# Altium footprint library IC.PcbLib: 85 footprints (part 5 of 6)
Each footprint in its own frame and in the unit in brackets; x right, y up, seen from the top. Pads: shape width x height; smd on the part's side, far side on the other; paste and mask are expansions set on the pad; w line width, h text height; cw(c..) or ccw(c..) is an arc to the next point about the centre after c.
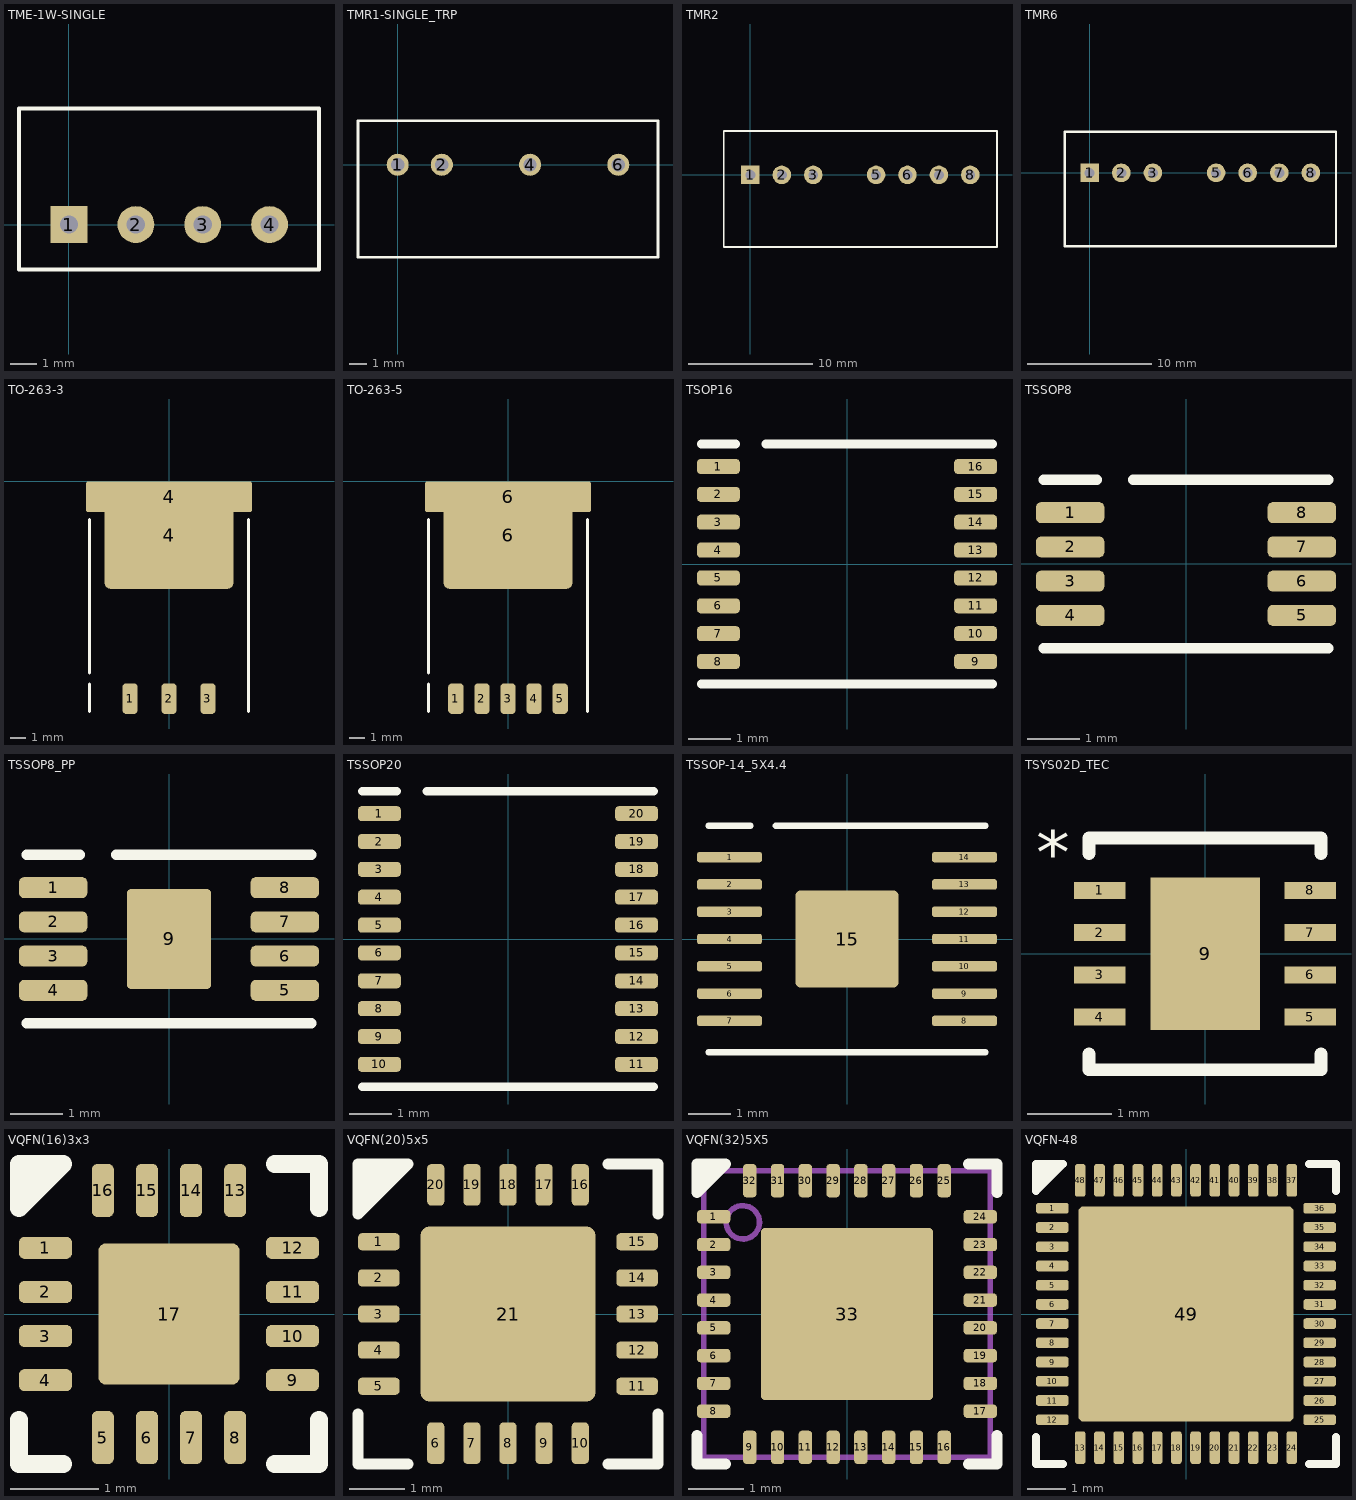
[diagram p4: the footprints below, top view; thin cyan lines are the x and y axes]

## TME-1W-SINGLE [mm]
pads (4):
  rect 1.4x1.4 hole 0.7: 1(0,0)
  round 1.4 hole 0.7: 2(2.54,0) 3(5.08,0) 4(7.62,0)
Top Overlay:
  lines w0.152: -1.9,-1.7 -1.9,4.4 9.5,4.4 9.5,-1.7 -1.9,-1.7
3D body: height 0.25, standoff 0, extent 0,0 0.254,0.254
3D body "tme_3d_drawing.stp": height 10, standoff -3.1, extent -1.89,-1.679 9.51,4.321

## TMR1-SINGLE_TRP [mil]
pads (4):
  round 50 hole 30: 1(0,0) 2(100,0) 4(300,0) 6(500,0)
Top Overlay:
  lines w6: -90,-210 -90,100 590,100 590,-210 -90,-210
3D body: height 10, standoff 0, extent 0,0 10,10
3D body "tmr1_single_3d_drawing.stp": height 413.39, standoff -145.67, extent -84.64,-205 584.65,95

## TMR2 [mm]
pads (7):
  rect 1.5x1.5 / inner round 1.27 / far side round 1.27 hole 0.8: 1(0,0)
  round 1.5 / inner round 1.27 / far side round 1.27 hole 0.8: 2(2.54,0) 3(5.08,0) 5(10.16,0) 6(12.7,0) 7(15.24,0) 8(17.78,0)
Top Overlay:
  lines w0.152: -2.159,-5.842 -2.159,3.556 19.939,3.556 19.939,-5.842 -2.159,-5.842
Bottom Overlay:
  circle w0.508: c-3.937,0 r0.381
3D body "tmr2_3d_drawing (1).stp": height 11.2, standoff -4.1, extent -2,-5.8 19.8,3.3

## TMR6 [mm]
pads (7):
  rect 1.5x1.5 / inner round 1.27 / far side round 1.27 hole 0.8: 1(0,0)
  round 1.5 / inner round 1.27 / far side round 1.27 hole 0.8: 2(2.54,0) 3(5.08,0) 5(10.16,0) 6(12.7,0) 7(15.24,0) 8(17.78,0)
Top Overlay:
  lines w0.2: -2,-5.9 -2,3.3 19.8,3.3 19.8,-5.9 -2,-5.9
Bottom Overlay:
  circle w0.508: c-3.937,0 r0.381
3D body "tmr6_3d_drawing.stp": height 11.2, standoff -4.1, extent -2,-5.82 19.8,3.28

## TO-263-3 [mm]
pads (5):
  rrect50% 1x2 smd: 1(-2.54,-14.17) 2(0,-14.17) 3(2.54,-14.17)
  rrect10% 8.4x7 smd: 4(0,-3.5)
  rrect10% 10.8x2 smd: 4(0,-1)
Top Overlay:
  lines w0.2: -5.2,-15 -5.2,-13.2 ; -5.2,-12.5 -5.2,-2.5 ; 5.2,-15 5.2,-2.5
3D body "LM1084IS-ADJ.STEP": height 4.65, standoff -0.15, extent -5.08,-14.651 5.08,-0.3

## TO-263-5 [mm]
pads (7):
  rrect50% 1x2 smd: 1(-3.4,-14.17) 2(-1.7,-14.17) 3(0,-14.17) 4(1.7,-14.17) 5(3.4,-14.17)
  rrect10% 8.4x7 smd: 6(0,-3.5)
  rrect10% 10.8x2 smd: 6(0,-1)
Top Overlay:
  lines w0.2: -5.2,-15 -5.2,-13.2 ; -5.2,-12.5 -5.2,-2.5 ; 5.2,-15 5.2,-2.5
3D body "KTT0005B.stp": height 4.57, standoff -0.15, extent -5.08,-14.7 5.08,-0.4

## TSOP16 [mm]
pads (16):
  rrect50% 1x0.35 smd: 1(-3,2.275) 2(-3,1.625) 3(-3,0.975) 4(-3,0.325) 5(-3,-0.325) 6(-3,-0.975) 7(-3,-1.625) 8(-3,-2.275) 9(3,-2.275) 10(3,-1.625) 11(3,-0.975) 12(3,-0.325) 13(3,0.325) 14(3,0.975) 15(3,1.625) 16(3,2.275)
Top Overlay:
  lines w0.2: -3.4,-2.8 3.4,-2.8 ; -3.4,2.8 -2.6,2.8 ; -1.9,2.8 3.4,2.8
3D body "User Library-User Library-TSSOP16.step": height 1.1, standoff 0, extent -3.19,-2.5 3.21,2.5

## TSSOP8 [mm]
pads (8):
  rrect50% 1.3x0.4 smd: 1(-2.2,0.975) 2(-2.2,0.325) 3(-2.2,-0.325) 4(-2.2,-0.975) 5(2.2,-0.975) 6(2.2,-0.325) 7(2.2,0.325) 8(2.2,0.975)
Top Overlay:
  lines w0.2: -2.7,-1.6 2.7,-1.6 ; -2.7,1.6 -1.7,1.6 ; -1,1.6 2.7,1.6
3D body "DGN0008D.stp": height 1.05, standoff -0.02, extent -2.45,-1.5 2.45,1.5

## TSSOP8_PP [mm]
pads (9):
  rrect50% 1.3x0.4 smd: 1(-2.2,0.975) 2(-2.2,0.325) 3(-2.2,-0.325) 4(-2.2,-0.975) 5(2.2,-0.975) 6(2.2,-0.325) 7(2.2,0.325) 8(2.2,0.975)
  rrect10% 1.6x1.9 smd: 9(0,0)
Top Overlay:
  lines w0.2: -2.7,-1.6 2.7,-1.6 ; -2.7,1.6 -1.7,1.6 ; -1,1.6 2.7,1.6
3D body "DGN0008D.stp": height 1.05, standoff -0.02, extent -2.45,-1.5 2.45,1.5

## TSSOP20 [mm]
pads (20):
  rrect50% 1x0.35 smd: 1(-3,2.925) 2(-3,2.275) 3(-3,1.625) 4(-3,0.975) 5(-3,0.325) 6(-3,-0.325) 7(-3,-0.975) 8(-3,-1.625) 9(-3,-2.275) 10(-3,-2.925) 11(3,-2.925) 12(3,-2.275) 13(3,-1.625) 14(3,-0.975) 15(3,-0.325) 16(3,0.325) 17(3,0.975) 18(3,1.625) 19(3,2.275) 20(3,2.925)
Top Overlay:
  lines w0.2: -3.4,-3.45 3.4,-3.45 ; -3.4,3.45 -2.6,3.45 ; -1.9,3.45 3.4,3.45
3D body "TSSOP20.step": height 1.2, standoff 0, extent -3.302,-3.302 3.302,3.302

## TSSOP-14_5X4.4 [mm]
pads (15):
  rrect50% 1.55x0.25 smd: 1(-2.8,1.95) 2(-2.8,1.3) 3(-2.8,0.65) 4(-2.8,0) 5(-2.8,-0.65) 6(-2.8,-1.3) 7(-2.8,-1.95) 8(2.8,-1.95) 9(2.8,-1.3) 10(2.8,-0.65) 11(2.8,0) 12(2.8,0.65) 13(2.8,1.3) 14(2.8,1.95)
  rrect10% 2.46x2.31 smd: 15(0,0)
Top Layer:
  region: 0,1.155
  region: 0,-1.155
Top Overlay:
  lines w0.152: -3.3,-2.7 0,-2.7 3.3,-2.7 ; -3.3,2.7 -2.3,2.7 ; -1.7,2.7 3.3,2.7
Top Solder:
  region: 0,1.155
  region: 0,-1.155
3D body "PWP0014E.stp": height 1.13, standoff 0, extent -3.2,-2.5 3.2,2.5

## TSYS02D_TEC [mil]
pads (9):
  rect 24x8 smd paste+0: 1(-49,29.53) 2(-49,9.84) 3(-49,-9.84) 4(-49,-29.53) 5(49,-29.53) 6(49,-9.84) 7(49,9.84) 8(49,29.53)
  rect 51x71 smd paste+0: 9(0,0)
Top Overlay:
  lines w6: -54,-46.63 -54,-54 54,-54 54,-46.63 ; -54,46.63 -54,54 54,54 54,46.63
  text "*" at -78.74,28.38 h39.37
3D body "TSYS02S_TEC.step": height 30.12, standoff 0, extent -49.01,-49.01 49.02,49.02

## VQFN(16)3x3 [mm]
pads (17):
  rrect50% 0.6x0.25 smd: 1(-1.4,0.75) 2(-1.4,0.25) 3(-1.4,-0.25) 4(-1.4,-0.75) 9(1.4,-0.75) 10(1.4,-0.25) 11(1.4,0.25) 12(1.4,0.75)
  rrect50% 0.25x0.6 smd paste-0.412: 5(-0.75,-1.4) 6(-0.25,-1.4) 7(0.25,-1.4) 8(0.75,-1.4) 13(0.75,1.4) 14(0.25,1.4) 15(-0.25,1.4) 16(-0.75,1.4)
  rrect10% 1.6x1.6 smd: 17(0,0)
Top Overlay:
  region: -1.7,1.7 -1.7,1.2 -1.2,1.7
  lines w0.2: -1.7,-1.2 -1.7,-1.7 -1.2,-1.7 ; 1.2,-1.7 1.7,-1.7 1.7,-1.2 ; 1.2,1.7 1.7,1.7 1.7,1.2 ; -1.7,1.2 -1.2,1.7 -1.7,1.7 -1.7,1.2
3D body "THS4513RGTT.STEP": height 1, standoff 0, extent -1.5,-1.5 1.5,1.5

## VQFN(20)5x5 [mm]
pads (21):
  rrect50% 0.75x0.31 smd: 1(-2.325,1.3) 2(-2.325,0.65) 3(-2.325,0) 4(-2.325,-0.65) 5(-2.325,-1.3) 11(2.325,-1.3) 12(2.325,-0.65) 13(2.325,0) 14(2.325,0.65) 15(2.325,1.3)
  rrect50% 0.31x0.75 smd: 6(-1.3,-2.325) 7(-0.65,-2.325) 8(0,-2.325) 9(0.65,-2.325) 10(1.3,-2.325) 16(1.3,2.325) 17(0.65,2.325) 18(0,2.325) 19(-0.65,2.325) 20(-1.3,2.325)
  rrect10% 3.15x3.15 smd: 21(0,0)
Top Overlay:
  region: -2.7,2.7 -2.7,1.8 -1.8,2.7
  lines w0.2: -2.7,-1.8 -2.7,-2.7 -1.8,-2.7 ; 1.8,-2.7 2.7,-2.7 2.7,-1.8 ; 1.8,2.7 2.7,2.7 2.7,1.8 ; -2.7,1.8 -1.8,2.7 -2.7,2.7 -2.7,1.8
3D body "TPS7A4700RGWT.STEP": height 1, standoff 0, extent -2.5,-2.5 2.5,2.5

## VQFN(32)5X5 [mm]
pads (33):
  rrect50% 0.6x0.24 smd: 1(-2.4,1.75) 2(-2.4,1.25) 3(-2.4,0.75) 4(-2.4,0.25) 5(-2.4,-0.25) 6(-2.4,-0.75) 7(-2.4,-1.25) 8(-2.4,-1.75) 17(2.4,-1.75) 18(2.4,-1.25) 19(2.4,-0.75) 20(2.4,-0.25) 21(2.4,0.25) 22(2.4,0.75) 23(2.4,1.25) 24(2.4,1.75)
  rrect50% 0.24x0.6 smd: 9(-1.75,-2.4) 10(-1.25,-2.4) 11(-0.75,-2.4) 12(-0.25,-2.4) 13(0.25,-2.4) 14(0.75,-2.4) 15(1.25,-2.4) 16(1.75,-2.4) 25(1.75,2.4) 26(1.25,2.4) 27(0.75,2.4) 28(0.25,2.4) 29(-0.25,2.4) 30(-0.75,2.4) 31(-1.25,2.4) 32(-1.75,2.4)
  rrect5% 3.1x3.1 smd: 33(0,0)
Top Overlay:
  region: -2.7,2.7 -2.7,2.2 -2.2,2.7
  lines w0.2: -2.7,-2.191 -2.7,-2.7 -2.191,-2.7 ; 2.191,-2.7 2.7,-2.7 2.7,-2.191 ; 2.191,2.7 2.7,2.7 2.7,2.191 ; -2.7,2.191 -2.191,2.7 -2.7,2.7 -2.7,2.191
Top Paste:
  region: 0.15,-0.1 0.1,-0.15 0.1,-1.4 0.15,-1.45 1.4,-1.45 1.45,-1.4 1.45,-0.15 1.4,-0.1
  region: -0.15,-0.1 -0.1,-0.15 -0.1,-1.4 -0.15,-1.45 -1.4,-1.45 -1.45,-1.4 -1.45,-0.15 -1.4,-0.1
  region: -0.15,0.1 -0.1,0.15 -0.1,1.4 -0.15,1.45 -1.4,1.45 -1.45,1.4 -1.45,0.15 -1.4,0.1
  region: 0.15,0.1 0.1,0.15 0.1,1.4 0.15,1.45 1.4,1.45 1.45,1.4 1.45,0.15 1.4,0.1
Mechanical 13:
  circle w0.1: c-1.875,1.65 r0.3
  lines w0.1: -2.575,-2.575 -2.575,2.575 2.575,2.575 2.575,-2.575 -2.575,-2.575
  text ".Designator" at -1.524,-1.143 h1.27
3D body: height 0.25, standoff 0, extent 0,0 0.254,0.254
3D body "RTV0032A.stp": height 0.8, standoff 0, extent -2.5,-2.5 2.5,2.5

## VQFN-48 [mm]
pads (49):
  rrect50% 0.85x0.28 smd: 1(-3.475,2.75) 2(-3.475,2.25) 3(-3.475,1.75) 4(-3.475,1.25) 5(-3.475,0.75) 6(-3.475,0.25) 7(-3.475,-0.25) 8(-3.475,-0.75) 9(-3.475,-1.25) 10(-3.475,-1.75) 11(-3.475,-2.25) 12(-3.475,-2.75) 25(3.475,-2.75) 26(3.475,-2.25) 27(3.475,-1.75) 28(3.475,-1.25) 29(3.475,-0.75) 30(3.475,-0.25) 31(3.475,0.25) 32(3.475,0.75) 33(3.475,1.25) 34(3.475,1.75) 35(3.475,2.25) 36(3.475,2.75)
  rrect50% 0.28x0.85 smd: 13(-2.751,-3.475) 14(-2.251,-3.475) 15(-1.75,-3.475) 16(-1.25,-3.475) 17(-0.75,-3.475) 18(-0.25,-3.475) 19(0.25,-3.475) 20(0.75,-3.475) 21(1.25,-3.475) 22(1.75,-3.475) 23(2.251,-3.475) 24(2.751,-3.475) 37(2.751,3.475) 38(2.251,3.475) 39(1.75,3.475) 40(1.25,3.475) 41(0.75,3.475) 42(0.25,3.475) 43(-0.25,3.475) 44(-0.75,3.475) 45(-1.25,3.475) 46(-1.75,3.475) 47(-2.251,3.475) 48(-2.751,3.475)
  rrect5% 5.6x5.6 smd: 49(0,0)
Top Overlay:
  region: -3.9,3.9 -3.9,3.2 -3.2,3.9
  lines w0.2: -3.9,-3.2 -3.9,-3.9 -3.2,-3.9 ; 3.2,-3.9 3.9,-3.9 3.9,-3.2 ; 3.2,3.9 3.9,3.9 3.9,3.2 ; -3.9,3.2 -3.9,3.9 -3.2,3.9 -3.9,3.2
3D body "RGZ48_5P6X5P6.step": height 1.4, standoff 0, extent -3.626,-3.626 3.626,3.626